# Altium footprint library MyLib.PcbLib: 575 footprints (part 26 of 36)
Each footprint in its own frame and in the unit in brackets; x right, y up, seen from the top. Pads: shape width x height; smd on the part's side, far side on the other; paste and mask are expansions set on the pad; w line width, h text height; cw(c..) or ccw(c..) is an arc to the next point about the centre after c.
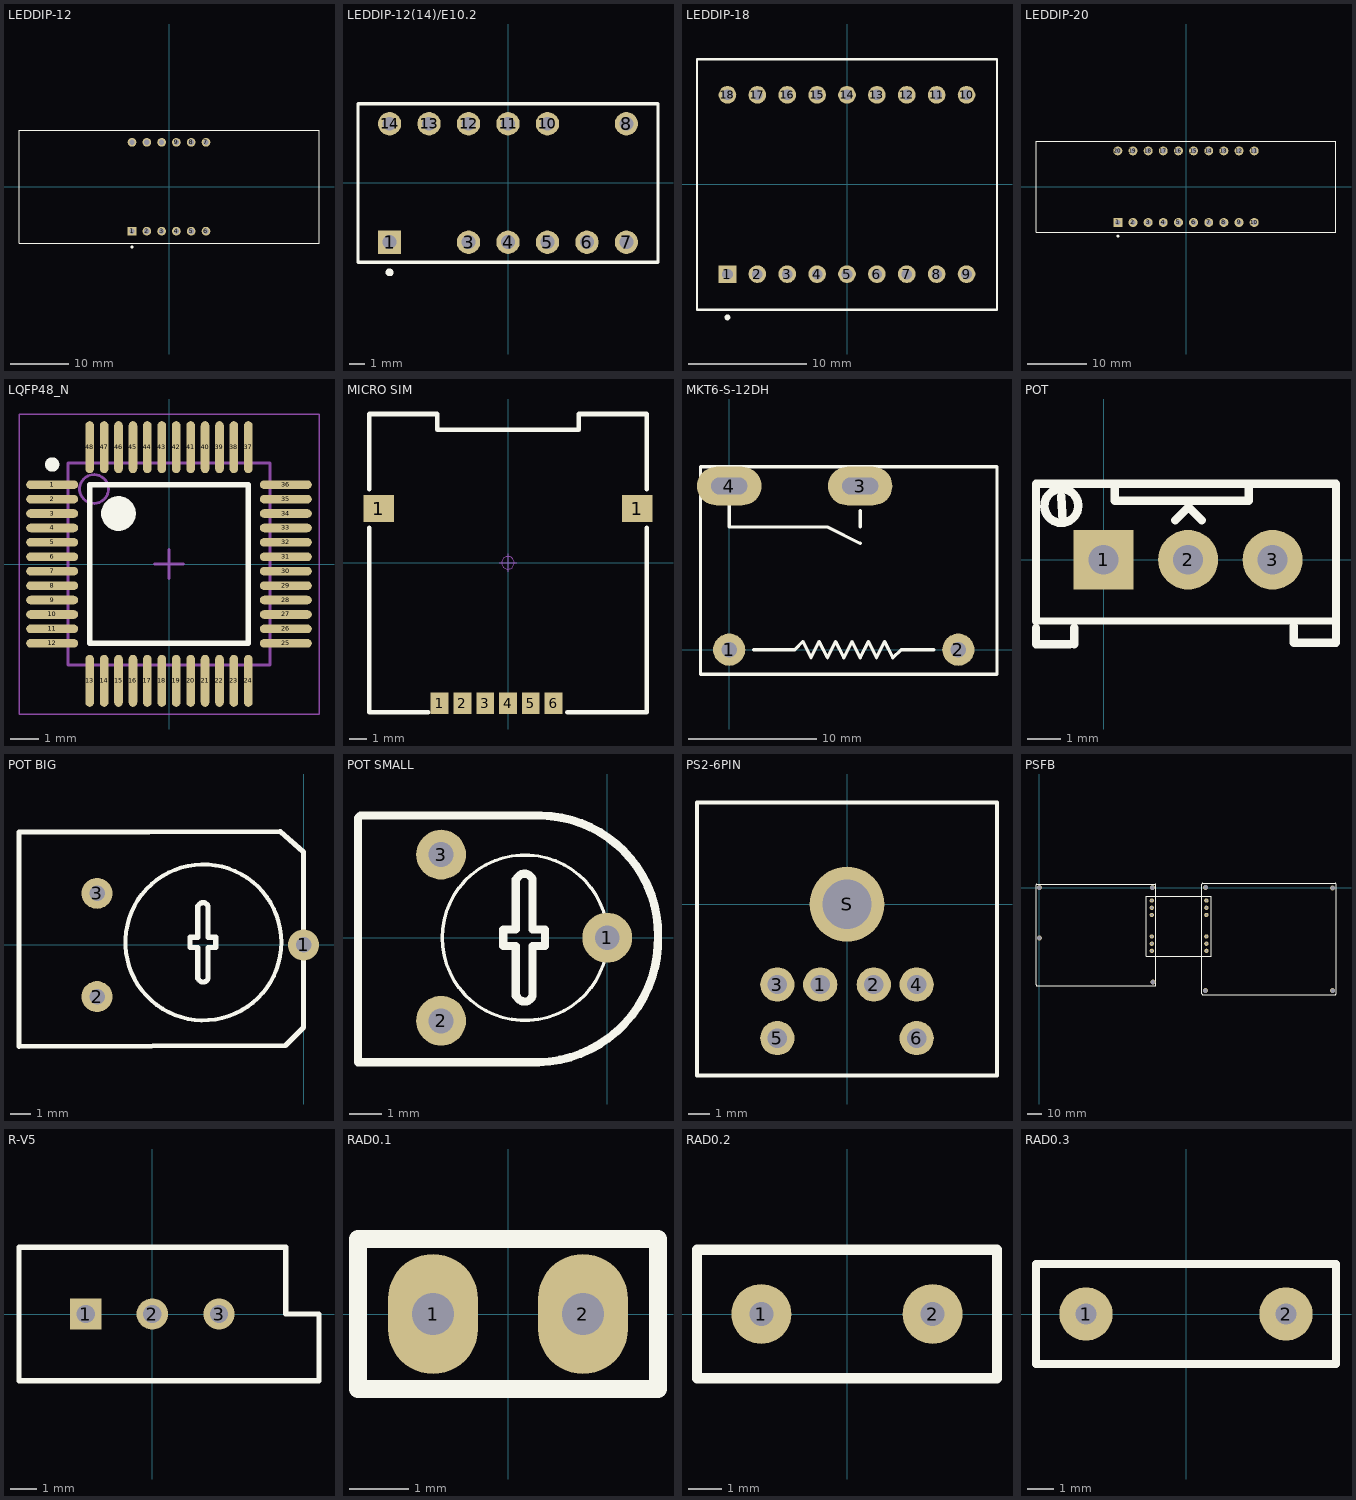
[diagram p25: the footprints below, top view; thin cyan lines are the x and y axes]

## LEDDIP-12 [mm]
pads (12):
  rect 1.5x1.5 hole 0.9: 1(-6.35,-7.62)
  round 1.5 hole 0.9: 2(-3.81,-7.62) 3(-1.27,-7.62) 4(1.27,-7.62) 5(3.81,-7.62) 6(6.35,-7.62) 7(6.35,7.62) 8(3.81,7.62) 9(1.27,7.62) 10(-1.27,7.62) 11(-3.81,7.62) 12(-6.35,7.62)
Top Overlay:
  circle w0.25: c-6.35,-10.35 r0.125
  lines w0.2: -25.75,-9.7 -25.75,9.7 25.75,9.7 25.75,-9.7 -25.75,-9.7

## LEDDIP-12(14)/E10.2 [mm]
pads (12):
  rect 1.5x1.5 hole 0.9: 1(-7.62,-3.81)
  round 1.5 hole 0.9: 3(-2.54,-3.81) 4(0,-3.81) 5(2.54,-3.81) 6(5.08,-3.81) 7(7.62,-3.81) 8(7.62,3.81) 10(2.54,3.81) 11(0,3.81) 12(-2.54,3.81) 13(-5.08,3.81) 14(-7.62,3.81)
Top Overlay:
  circle w0.25: c-7.62,-5.75 r0.125
  lines w0.2: -9.65,-5.1 -9.65,5.1 9.65,5.1 9.65,-5.1 -9.65,-5.1

## LEDDIP-18 [mm]
pads (18):
  rect 1.5x1.5 hole 0.9: 1(-10.16,-7.62)
  round 1.5 hole 0.9: 2(-7.62,-7.62) 3(-5.08,-7.62) 4(-2.54,-7.62) 5(0,-7.62) 6(2.54,-7.62) 7(5.08,-7.62) 8(7.62,-7.62) 9(10.16,-7.62) 10(10.16,7.62) 11(7.62,7.62) 12(5.08,7.62) 13(2.54,7.62) 14(0,7.62) 15(-2.54,7.62) 16(-5.08,7.62) 17(-7.62,7.62) 18(-10.16,7.62)
Top Overlay:
  circle w0.25: c-10.16,-11.3 r0.125
  lines w0.2: -12.75,-10.65 12.75,-10.65 12.75,10.65 -12.75,10.65 -12.75,-10.65

## LEDDIP-20 [mm]
pads (20):
  rect 1.5x1.5 hole 0.9: 1(-11.43,-6)
  round 1.5 hole 0.9: 2(-8.89,-6) 3(-6.35,-6) 4(-3.81,-6) 5(-1.27,-6) 6(1.27,-6) 7(3.81,-6) 8(6.35,-6) 9(8.89,-6) 10(11.43,-6) 11(11.43,6) 12(8.89,6) 13(6.35,6) 14(3.81,6) 15(1.27,6) 16(-1.27,6) 17(-3.81,6) 18(-6.35,6) 19(-8.89,6) 20(-11.43,6)
Top Overlay:
  circle w0.25: c-11.43,-8.3 r0.125
  lines w0.2: -25.15,-7.65 -25.15,7.65 25.15,7.65 25.15,-7.65 -25.15,-7.65

## LQFP48_N [mm] "Thin QFP, 48-Leads, Body 7x7mm, Pitch 0.5mm, IPC Medium Density"
height 1.6
pads (48):
  oval 1.8x0.3 smd: 1(-4.05,2.75) 2(-4.05,2.25) 3(-4.05,1.75) 4(-4.05,1.25) 5(-4.05,0.75) 6(-4.05,0.25) 7(-4.05,-0.25) 8(-4.05,-0.75) 9(-4.05,-1.25) 10(-4.05,-1.75) 11(-4.05,-2.25) 12(-4.05,-2.75) 25(4.05,-2.75) 26(4.05,-2.25) 27(4.05,-1.75) 28(4.05,-1.25) 29(4.05,-0.75) 30(4.05,-0.25) 31(4.05,0.25) 32(4.05,0.75) 33(4.05,1.25) 34(4.05,1.75) 35(4.05,2.25) 36(4.05,2.75)
  oval 0.3x1.8 smd: 13(-2.75,-4.05) 14(-2.25,-4.05) 15(-1.75,-4.05) 16(-1.25,-4.05) 17(-0.75,-4.05) 18(-0.25,-4.05) 19(0.25,-4.05) 20(0.75,-4.05) 21(1.25,-4.05) 22(1.75,-4.05) 23(2.25,-4.05) 24(2.75,-4.05) 37(2.75,4.05) 38(2.25,4.05) 39(1.75,4.05) 40(1.25,4.05) 41(0.75,4.05) 42(0.25,4.05) 43(-0.25,4.05) 44(-0.75,4.05) 45(-1.25,4.05) 46(-1.75,4.05) 47(-2.25,4.05) 48(-2.75,4.05)
Top Overlay:
  circle w0.6: c-1.75,1.75 r0.3
  circle w0.25: c-4.05,3.45 r0.125
  lines w0.2: -2.75,-2.75 2.75,-2.75 2.75,2.75 -2.75,2.75 -2.75,-2.75
Mechanical 13:
  circle w0.1: c-2.6,2.6 r0.5
  lines w0.1: -3.5,-3.5 3.5,-3.5 3.5,3.5 -3.5,3.5 -3.5,-3.5
Mechanical 15:
  lines w0.05: -5.2,-5.2 5.2,-5.2 5.2,5.2 -5.2,5.2 -5.2,-5.2
  lines w0.1: -0.5,0 0.5,0 ; 0,-0.5 0,0.5
3D body: height 1.6, standoff 0, extent -3.5,-3.5 3.5,3.5

## MICRO SIM [mm] "Micro_SIM_16.30mm*14.66mm*1.8mm(长*宽*厚）"
pads (8):
  rect 1.7x1.5 smd: 1(-7.2,3.02) 1(7.2,3.02)
  rect 1x1.2 smd: 1(-3.81,-7.83) 2(-2.54,-7.83) 3(-1.27,-7.83) 4(0,-7.83) 5(1.27,-7.83) 6(2.54,-7.83)
Top Overlay:
  lines w0.254: -7.747,1.949 -7.747,-8.338 -4.445,-8.338 ; -7.747,4.108 -7.747,8.299 -3.937,8.299 -3.937,7.41 3.937,7.41 3.937,8.299 7.747,8.299 7.747,4.108 ; 3.302,-8.338 7.747,-8.338 7.747,1.949
Mechanical 15:
  circle w0.05: c0,0 r0.35
  lines w0.05: -0.5,0 0.5,0 ; 0,-0.5 0,0.5
3D body "MICRO SIM.STEP": height 1.85, standoff 0.04, extent -7.58,-8.13 7.58,8.13

## MKT6-S-12DH [mm] "单刀单投/常开"
pads (4):
  round 2.5 hole 1.2: 1(0,0) 2(17.78,0)
  oval 5x3 hole 1.3 slot 2.8 at 0 deg: 3(10.16,12.7) 4(0,12.7)
Top Overlay:
  lines w0.254: 0,11.43 0,9.525 6.985,9.525 7.62,9.525 10.16,8.255 ; 1.905,0 5.08,0 5.715,0.635 6.35,-0.635 6.985,0.635 7.62,-0.635 8.255,0.635 8.89,-0.635 9.525,0.635 10.16,-0.635 10.795,0.635 11.43,-0.635 12.065,0.635 12.7,-0.635 13.335,0 15.875,0 ; 10.16,9.525 10.16,10.795 ; -2.22,-1.9 20.78,-1.9 20.78,14.2 -2.22,14.2 -2.22,-1.9
3D body "MKT6-S-12DH-.STEP": height 10.2, standoff -3.9, extent -2.229,-1.876 20.771,14.224

## POT [mm]
pads (3):
  rect 1.8x1.8 hole 0.9: 1(0,0)
  round 1.8 hole 0.9: 2(2.54,0) 3(5.08,0)
Top Overlay:
  lines w0.203: -2.032,-1.841 6.921,-1.841
  lines w0.254: -2.032,-2.54 -2.032,-2.04 ; -2.032,-1.841 -2.032,0.46 -2.032,1.604 -2.032,2.286 6.985,2.286 6.985,0 6.985,-2.5 5.715,-2.5 5.715,-2 ; -2.016,-2.54 -1.016,-2.54 ; -1.27,1.905 -1.225,1.153 ; -0.889,-2.54 -0.889,-2.04 ; -0.762,1.651 ccw(c-1.27,1.618) -0.761,1.608 ; 0.33,2.286 0.33,1.778 4.369,1.778 4.369,2.286 ; 2.159,1.194 2.553,1.587 2.946,1.194
3D body "SW3dPS-Potenciometro Vertical.STEP": height 12.46, standoff -5.04, extent -2.06,-2.438 7.14,2.362

## POT BIG [mil]
height 314.96
pads (3):
  round 60 hole 30: 1(0,0) 2(-400,-100) 3(-400,100)
Top Overlay:
  circle w7.87: c-194,5 r151.08
  lines w9.84: -204.06,-64.72 ccw(c-194.49,-61.84) -185,-65 ; -204.06,75.28 cw(c-194.58,72.12) -185,75
  lines w10: -205,-65 -205,-5 -220,-5 -220,15 -205,15 -205,75 ; -185,-65 -185,-5 -170,-5 -170,15 -185,15 -185,75 ; -551.18,-196.85 -35,-195 0,-160 0,-155 0,180 -45,220 -551.18,218.5 -551.18,-196.85

## POT SMALL [mil]
pads (3):
  round 60 hole 30: 1(0,0) 2(-200,-100) 3(-200,100)
Top Overlay:
  circle w3.94: c-99,0 r99.57
  lines w9.84: -109.06,-69.72 ccw(c-99.49,-66.84) -90,-70 ; -109.06,70.28 cw(c-99.58,67.12) -90,70
  lines w10: -110,-70 -110,-10 -125,-10 -125,10 -110,10 -110,70 ; -90,-70 -90,-10 -75,-10 -75,10 -90,10 -90,70 ; -300,-150 -300,144 -297,147 -79.78,147 cw(c-81.89,4.11) 61,2 cw(c-86.71,-2.29) -82.43,-150 -300,-150
3D body: height 314.96, standoff -78.74, extent -310.85,-149.99 64.95,150.01

## PS2-6PIN [mm] "PS2 Socket, 6 Pin, Through Hole"
pads (7):
  round 1.6 hole 0.9: 1(-1.25,-3.75) 2(1.25,-3.75) 3(-3.25,-3.75) 4(3.25,-3.75) 5(-3.25,-6.25) 6(3.25,-6.25)
  round 3.5 hole 2.3: S(0,0)
Top Overlay:
  lines w0.2: -7,-8 -7,4.75 7,4.75 7,-8 -7,-8

## PSFB [mm]
pads (12):
  round 3 hole 1.5: 1(78.308,-8.989) 2(78.308,-13.989) 3(78.308,-18.989) 4(78.308,-33.989) 5(78.308,-38.989) 6(78.308,-43.989) 7(116.308,-43.989) 8(116.308,-38.989) 9(116.308,-33.989) 10(116.308,-18.989) 11(116.308,-13.989) 12(116.308,-8.989)
via 115.775,0.225 diameter 3.5 hole 3
via 115.572,-71.708 diameter 3.5 hole 3
via 204.268,-71.708 diameter 3.5 hole 3
via 204.268,-0.156 diameter 3.5 hole 3
via 0,0 diameter 3.5 hole 3
via 78.689,0 diameter 3.5 hole 3
via 0,-35.103 diameter 3.5 hole 3
via 79.045,-65.811 diameter 3.5 hole 3
Top Overlay:
  lines w0.254: 113.844,-74.604 205.97,-74.604 ccw(c205.97,-73.969) 206.605,-73.969 206.605,2.485 ccw(c205.97,2.485) 205.97,3.12 113.895,3.12 ccw(c113.895,2.485) 113.26,2.485 113.26,-73.969 ccw(c113.895,-73.969) 113.895,-74.604 ; -2.362,-67.716 ccw(c-1.854,-67.716) -1.854,-68.224 80.696,-68.224 ccw(c80.696,-67.716) 81.204,-67.716 81.204,2.007 ccw(c80.696,2.007) 80.696,2.515 -1.854,2.515 ccw(c-1.854,2.007) -2.362,2.007 -2.362,-67.716 ; 74.308,-47.645 119.647,-47.645 119.647,-5.989 74.308,-5.989 74.308,-47.645

## R-V5 [mm]
pads (3):
  rect 1.2x1.2 hole 0.7: 1(-2.54,0)
  round 1.2 hole 0.7: 2(0,0) 3(2.54,0)
Top Overlay:
  lines w0.2: -5.08,-2.54 -5.08,2.54 5.08,2.54 5.08,0 6.35,0 6.35,-2.54 -5.08,-2.54
3D body "RES3296.STEP": height 11.55, standoff -6.4, extent -4.765,-2.369 4.765,2.462

## RAD0.1 [mil]
pads (2):
  oval 60x80 hole 28: 1(-50,0) 2(50,0)
Top Overlay:
  lines w12: -100,-50 -100,50 100,50 100,-50 -100,-50

## RAD0.2 [mil]
pads (2):
  round 70 hole 28: 1(-100,0) 2(100,0)
Top Overlay:
  lines w12: -175,-75 175,-75 175,75 -175,75 -175,-75

## RAD0.3 [mil]
pads (2):
  round 80 hole 32: 1(-150,0) 2(150,0)
Top Overlay:
  lines w12: -225,-75 -225,75 225,75 225,-75 -225,-75